# Altium footprint library CHIP.PcbLib: 86 footprints (part 3 of 6)
Each footprint in its own frame and in the unit in brackets; x right, y up, seen from the top. Pads: shape width x height; smd on the part's side, far side on the other; paste and mask are expansions set on the pad; w line width, h text height; cw(c..) or ccw(c..) is an arc to the next point about the centre after c.
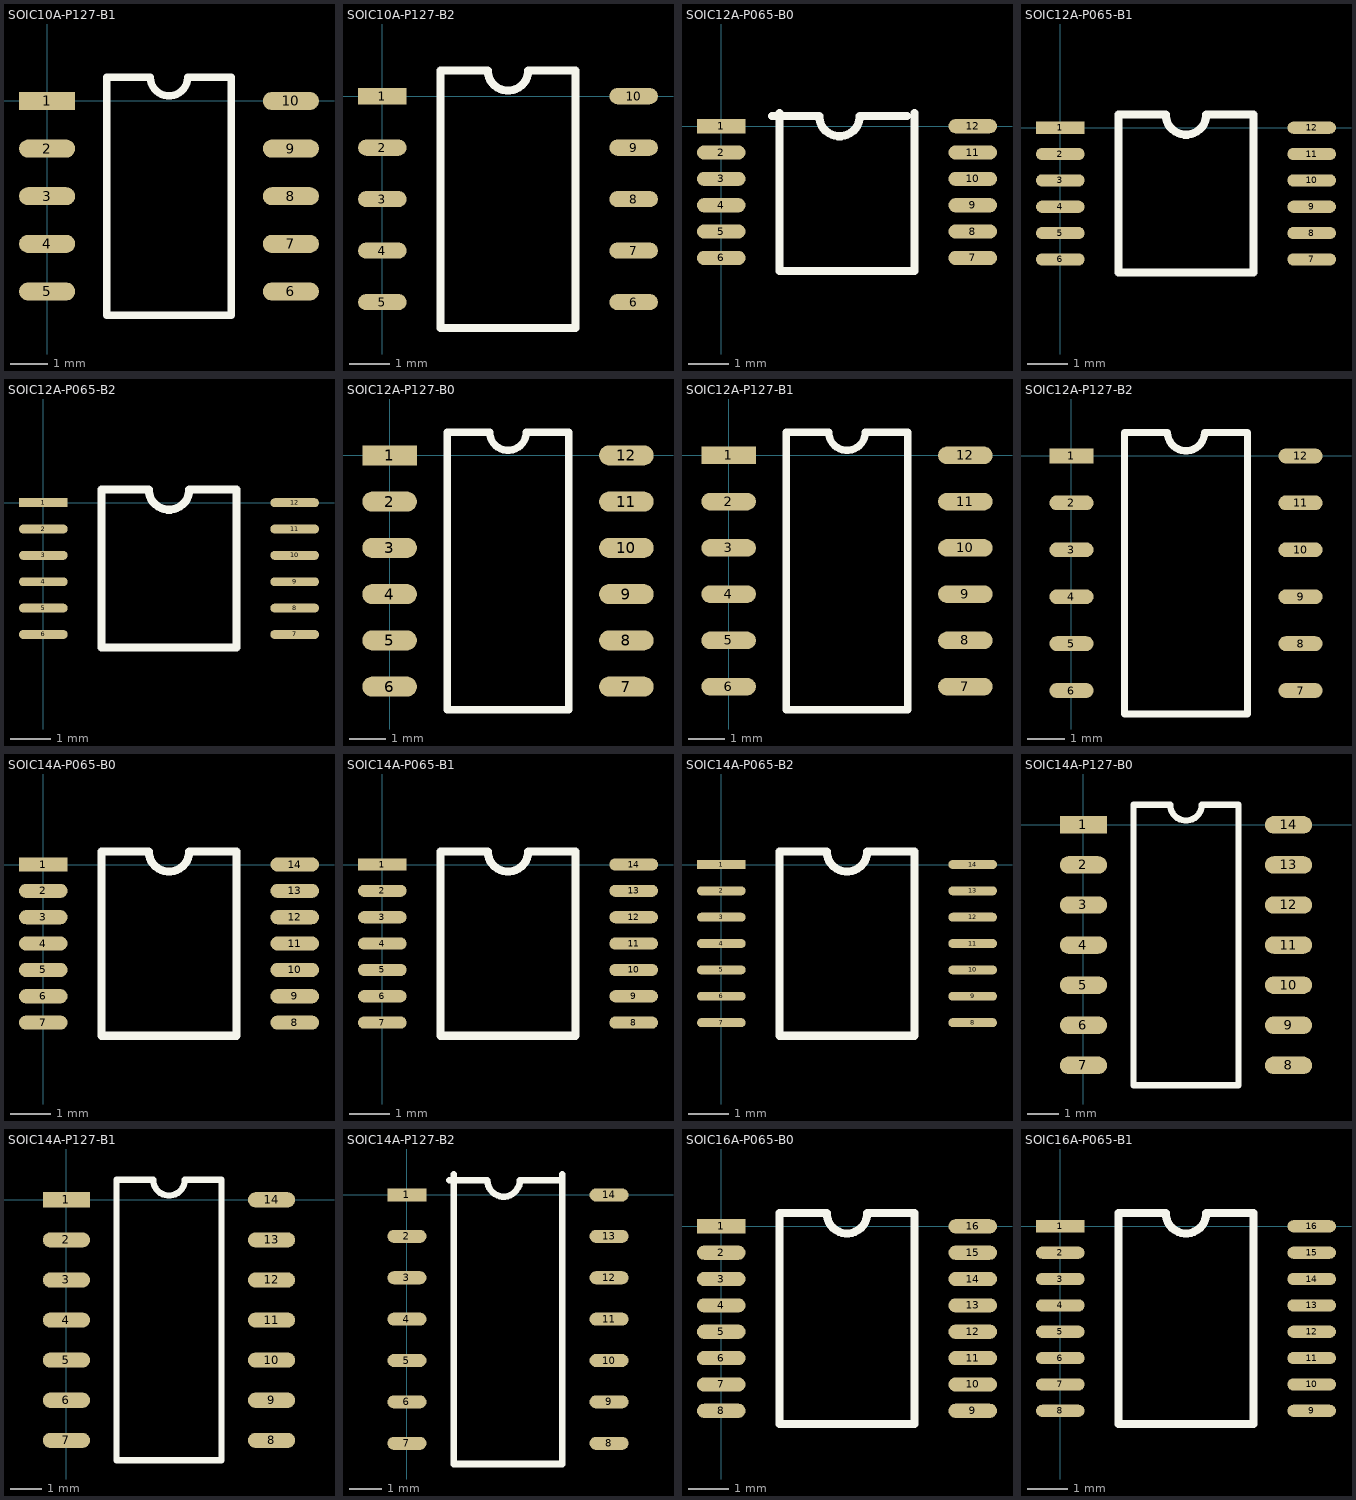
[diagram p2: the footprints below, top view; thin cyan lines are the x and y axes]

## SOIC10A-P127-B1 [mm]
pads (10):
  rect 1.5x0.48 smd: 1(0,0)
  oval 1.5x0.48 smd: 2(0,-1.27) 3(0,-2.54) 4(0,-3.81) 5(0,-5.08) 6(6.5,-5.08) 7(6.5,-3.81) 8(6.5,-2.54) 9(6.5,-1.27) 10(6.5,0)
Top Overlay:
  lines w0.2: 1.585,-5.715 4.915,-5.715 4.915,0.635 3.75,0.635 cw(c3.25,0.635) 2.75,0.635 1.585,0.635 1.585,-5.715

## SOIC10A-P127-B2 [mm]
pads (10):
  rect 1.2x0.4 smd: 1(0,0)
  oval 1.2x0.4 smd: 2(0,-1.27) 3(0,-2.54) 4(0,-3.81) 5(0,-5.08) 6(6.2,-5.08) 7(6.2,-3.81) 8(6.2,-2.54) 9(6.2,-1.27) 10(6.2,0)
Top Overlay:
  lines w0.2: 1.435,-5.715 4.765,-5.715 4.765,0.635 3.6,0.635 cw(c3.1,0.635) 2.6,0.635 1.435,0.635 1.435,-5.715

## SOIC12A-P065-B0 [mm]
pads (12):
  rect 1.2x0.35 smd: 1(0,0)
  oval 1.2x0.35 smd: 2(0,-0.65) 3(0,-1.3) 4(0,-1.95) 5(0,-2.6) 6(0,-3.25) 7(6.2,-3.25) 8(6.2,-2.6) 9(6.2,-1.95) 10(6.2,-1.3) 11(6.2,-0.65) 12(6.2,0)
Top Overlay:
  lines w0.2: 1.25,0.25 2.415,0.25 ccw(c2.915,0.25) 3.415,0.25 4.58,0.25 ; 1.435,0.325 1.435,-3.575 4.765,-3.575 4.765,0.325

## SOIC12A-P065-B1 [mm]
pads (12):
  rect 1.2x0.3 smd: 1(0,0)
  oval 1.2x0.3 smd: 2(0,-0.65) 3(0,-1.3) 4(0,-1.95) 5(0,-2.6) 6(0,-3.25) 7(6.2,-3.25) 8(6.2,-2.6) 9(6.2,-1.95) 10(6.2,-1.3) 11(6.2,-0.65) 12(6.2,0)
Top Overlay:
  lines w0.2: 1.435,-3.575 1.435,0.325 2.6,0.325 ccw(c3.1,0.325) 3.6,0.325 4.765,0.325 4.765,-3.575 1.435,-3.575

## SOIC12A-P065-B2 [mm]
pads (12):
  rect 1.2x0.22 smd: 1(0,0)
  oval 1.2x0.22 smd: 2(0,-0.65) 3(0,-1.3) 4(0,-1.95) 5(0,-2.6) 6(0,-3.25) 7(6.2,-3.25) 8(6.2,-2.6) 9(6.2,-1.95) 10(6.2,-1.3) 11(6.2,-0.65) 12(6.2,0)
Top Overlay:
  lines w0.2: 1.435,-3.575 4.765,-3.575 4.765,0.325 3.6,0.325 cw(c3.1,0.325) 2.6,0.325 1.435,0.325 1.435,-3.575

## SOIC12A-P127-B0 [mm]
pads (12):
  rect 1.5x0.55 smd: 1(0,0)
  oval 1.5x0.55 smd: 2(0,-1.27) 3(0,-2.54) 4(0,-3.81) 5(0,-5.08) 6(0,-6.35) 7(6.5,-6.35) 8(6.5,-5.08) 9(6.5,-3.81) 10(6.5,-2.54) 11(6.5,-1.27) 12(6.5,0)
Top Overlay:
  lines w0.2: 1.585,-6.985 4.915,-6.985 4.915,0.635 3.75,0.635 cw(c3.25,0.635) 2.75,0.635 1.585,0.635 1.585,-6.985

## SOIC12A-P127-B1 [mm]
pads (12):
  rect 1.5x0.48 smd: 1(0,0)
  oval 1.5x0.48 smd: 2(0,-1.27) 3(0,-2.54) 4(0,-3.81) 5(0,-5.08) 6(0,-6.35) 7(6.5,-6.35) 8(6.5,-5.08) 9(6.5,-3.81) 10(6.5,-2.54) 11(6.5,-1.27) 12(6.5,0)
Top Overlay:
  lines w0.2: 1.585,-6.985 1.585,0.635 2.75,0.635 ccw(c3.25,0.635) 3.75,0.635 4.915,0.635 4.915,-6.985 1.585,-6.985

## SOIC12A-P127-B2 [mm]
pads (12):
  rect 1.2x0.4 smd: 1(0,0)
  oval 1.2x0.4 smd: 2(0,-1.27) 3(0,-2.54) 4(0,-3.81) 5(0,-5.08) 6(0,-6.35) 7(6.2,-6.35) 8(6.2,-5.08) 9(6.2,-3.81) 10(6.2,-2.54) 11(6.2,-1.27) 12(6.2,0)
Top Overlay:
  lines w0.2: 1.435,-6.985 4.765,-6.985 4.765,0.635 3.6,0.635 cw(c3.1,0.635) 2.6,0.635 1.435,0.635 1.435,-6.985

## SOIC14A-P065-B0 [mm]
pads (14):
  rect 1.2x0.35 smd: 1(0,0)
  oval 1.2x0.35 smd: 2(0,-0.65) 3(0,-1.3) 4(0,-1.95) 5(0,-2.6) 6(0,-3.25) 7(0,-3.9) 8(6.2,-3.9) 9(6.2,-3.25) 10(6.2,-2.6) 11(6.2,-1.95) 12(6.2,-1.3) 13(6.2,-0.65) 14(6.2,0)
Top Overlay:
  lines w0.2: 1.435,-4.225 1.435,0.325 2.6,0.325 ccw(c3.1,0.325) 3.6,0.325 4.765,0.325 4.765,-4.225 1.435,-4.225

## SOIC14A-P065-B1 [mm]
pads (14):
  rect 1.2x0.3 smd: 1(0,0)
  oval 1.2x0.3 smd: 2(0,-0.65) 3(0,-1.3) 4(0,-1.95) 5(0,-2.6) 6(0,-3.25) 7(0,-3.9) 8(6.2,-3.9) 9(6.2,-3.25) 10(6.2,-2.6) 11(6.2,-1.95) 12(6.2,-1.3) 13(6.2,-0.65) 14(6.2,0)
Top Overlay:
  lines w0.2: 1.435,-4.225 1.435,0.325 2.6,0.325 ccw(c3.1,0.325) 3.6,0.325 4.765,0.325 4.765,-4.225 1.435,-4.225

## SOIC14A-P065-B2 [mm]
pads (14):
  rect 1.2x0.22 smd: 1(0,0)
  oval 1.2x0.22 smd: 2(0,-0.65) 3(0,-1.3) 4(0,-1.95) 5(0,-2.6) 6(0,-3.25) 7(0,-3.9) 8(6.2,-3.9) 9(6.2,-3.25) 10(6.2,-2.6) 11(6.2,-1.95) 12(6.2,-1.3) 13(6.2,-0.65) 14(6.2,0)
Top Overlay:
  lines w0.2: 1.435,-4.225 1.435,0.325 2.6,0.325 ccw(c3.1,0.325) 3.6,0.325 4.765,0.325 4.765,-4.225 1.435,-4.225

## SOIC14A-P127-B0 [mm]
pads (14):
  rect 1.5x0.55 smd: 1(0,0)
  oval 1.5x0.55 smd: 2(0,-1.27) 3(0,-2.54) 4(0,-3.81) 5(0,-5.08) 6(0,-6.35) 7(0,-7.62) 8(6.5,-7.62) 9(6.5,-6.35) 10(6.5,-5.08) 11(6.5,-3.81) 12(6.5,-2.54) 13(6.5,-1.27) 14(6.5,0)
Top Overlay:
  lines w0.2: 1.585,-8.255 4.915,-8.255 4.915,0.635 3.75,0.635 cw(c3.25,0.635) 2.75,0.635 1.585,0.635 1.585,-8.255

## SOIC14A-P127-B1 [mm]
pads (14):
  rect 1.5x0.48 smd: 1(0,0)
  oval 1.5x0.48 smd: 2(0,-1.27) 3(0,-2.54) 4(0,-3.81) 5(0,-5.08) 6(0,-6.35) 7(0,-7.62) 8(6.5,-7.62) 9(6.5,-6.35) 10(6.5,-5.08) 11(6.5,-3.81) 12(6.5,-2.54) 13(6.5,-1.27) 14(6.5,0)
Top Overlay:
  lines w0.2: 1.585,-8.255 4.915,-8.255 4.915,0.635 3.75,0.635 cw(c3.25,0.635) 2.75,0.635 1.585,0.635 1.585,-8.255

## SOIC14A-P127-B2 [mm]
pads (14):
  rect 1.2x0.4 smd: 1(0,0)
  oval 1.2x0.4 smd: 2(0,-1.27) 3(0,-2.54) 4(0,-3.81) 5(0,-5.08) 6(0,-6.35) 7(0,-7.62) 8(6.2,-7.62) 9(6.2,-6.35) 10(6.2,-5.08) 11(6.2,-3.81) 12(6.2,-2.54) 13(6.2,-1.27) 14(6.2,0)
Top Overlay:
  lines w0.2: 1.3,0.45 2.465,0.45 ccw(c2.965,0.45) 3.465,0.45 4.63,0.45 ; 1.435,0.635 1.435,-8.255 4.765,-8.255 4.765,0.635

## SOIC16A-P065-B0 [mm]
pads (16):
  rect 1.2x0.35 smd: 1(0,0)
  oval 1.2x0.35 smd: 2(0,-0.65) 3(0,-1.3) 4(0,-1.95) 5(0,-2.6) 6(0,-3.25) 7(0,-3.9) 8(0,-4.55) 9(6.2,-4.55) 10(6.2,-3.9) 11(6.2,-3.25) 12(6.2,-2.6) 13(6.2,-1.95) 14(6.2,-1.3) 15(6.2,-0.65) 16(6.2,0)
Top Overlay:
  lines w0.2: 1.435,-4.875 4.765,-4.875 4.765,0.325 3.6,0.325 cw(c3.1,0.325) 2.6,0.325 1.435,0.325 1.435,-4.875

## SOIC16A-P065-B1 [mm]
pads (16):
  rect 1.2x0.3 smd: 1(0,0)
  oval 1.2x0.3 smd: 2(0,-0.65) 3(0,-1.3) 4(0,-1.95) 5(0,-2.6) 6(0,-3.25) 7(0,-3.9) 8(0,-4.55) 9(6.2,-4.55) 10(6.2,-3.9) 11(6.2,-3.25) 12(6.2,-2.6) 13(6.2,-1.95) 14(6.2,-1.3) 15(6.2,-0.65) 16(6.2,0)
Top Overlay:
  lines w0.2: 1.435,-4.875 1.435,0.325 2.6,0.325 ccw(c3.1,0.325) 3.6,0.325 4.765,0.325 4.765,-4.875 1.435,-4.875